# Altium schematic symbol library Sang_library.SchLib: 1607 symbols (part 15 of 15)
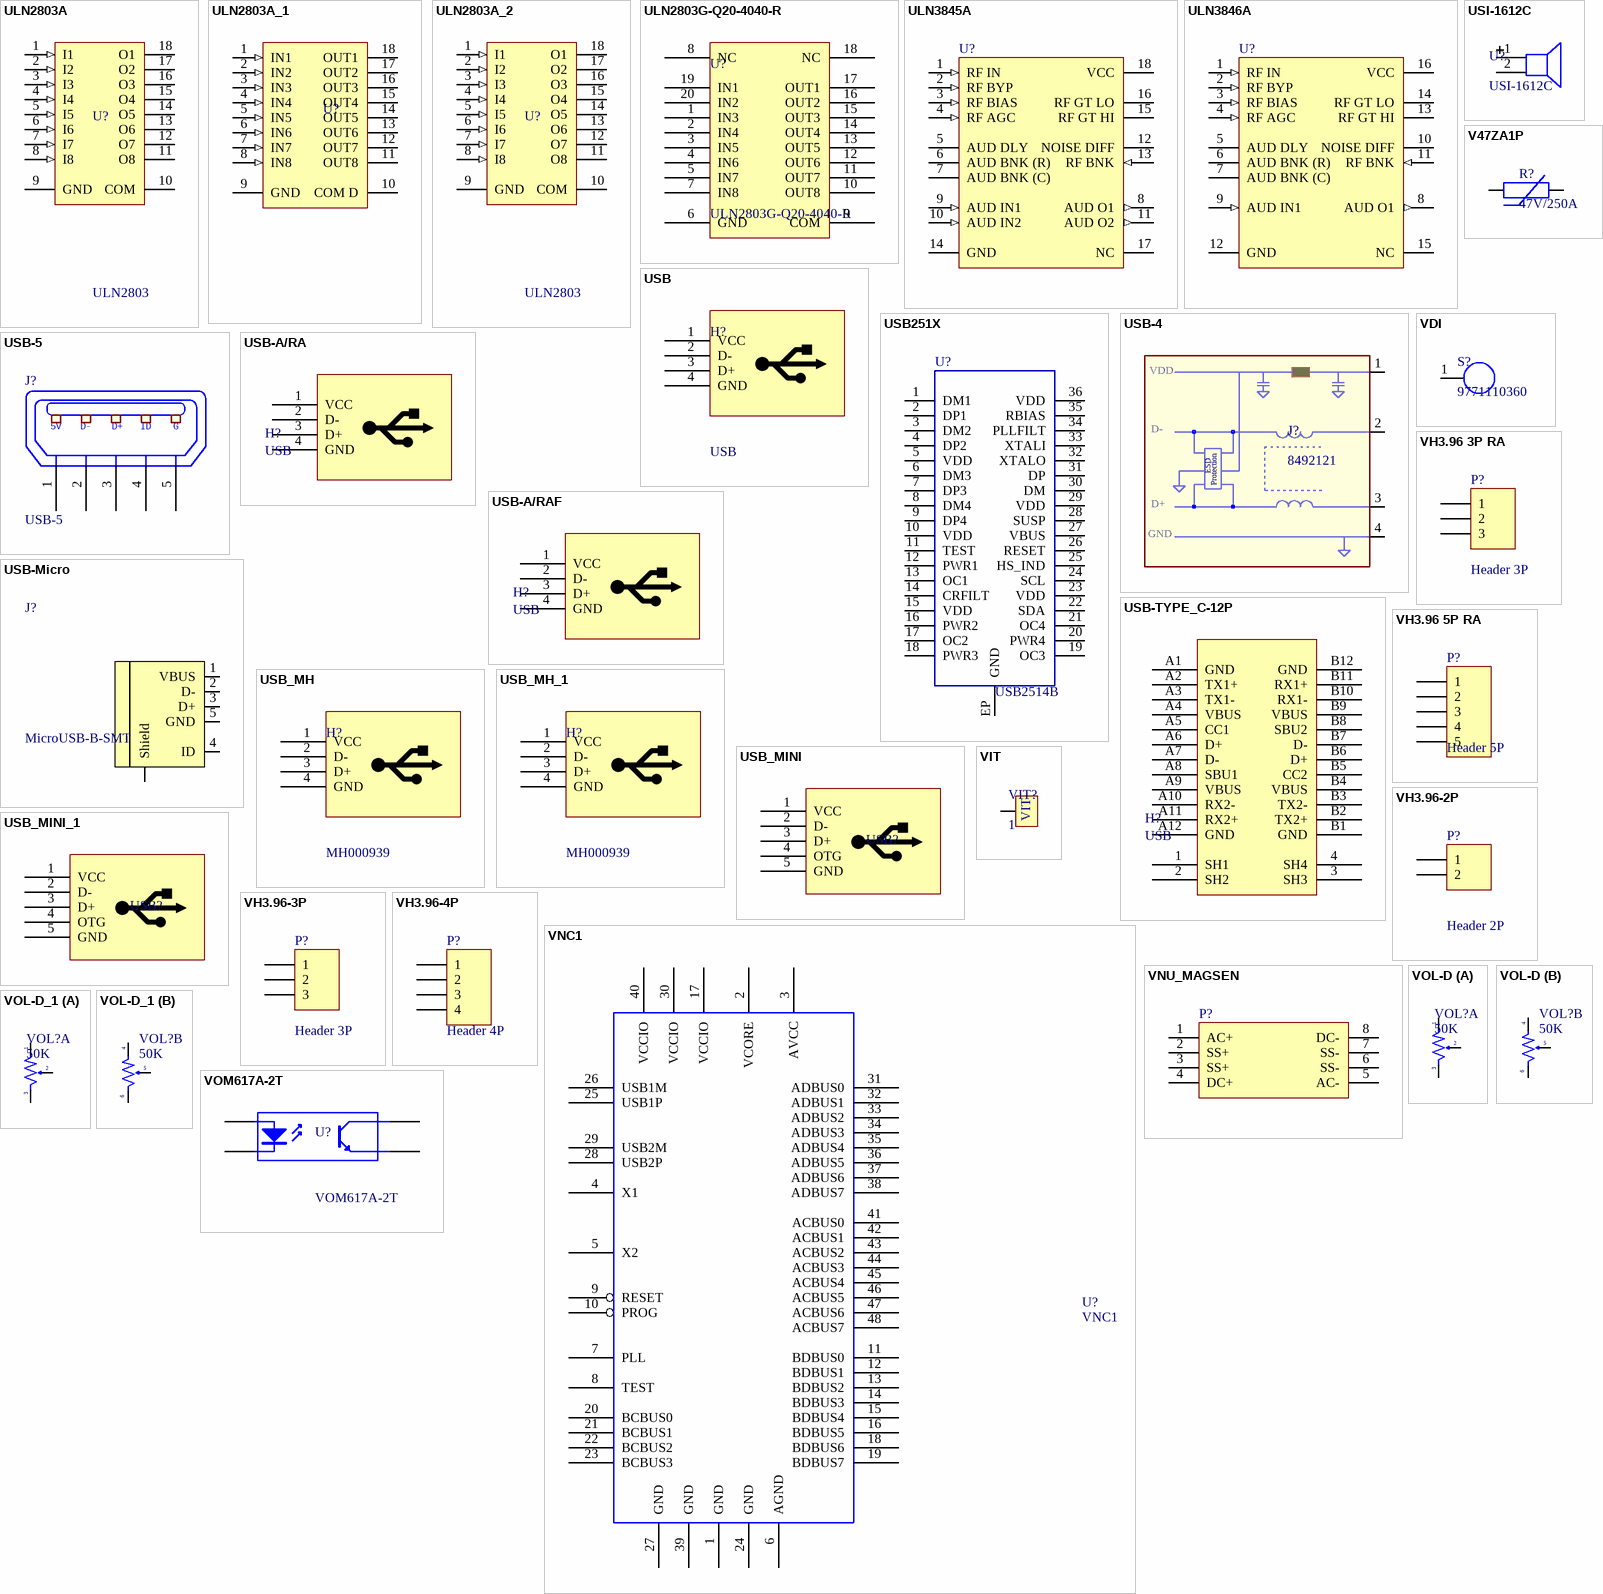
[diagram p111: symbols ULN2803A to VOM617A-2T]

## USB251X
designator U?, comment USB2514B
IC HUB CTLR 4PORT USB 2.0 HS 36S; MPN: USB2514B/M2; Solder: SMT; Value: USB2514B; Category: IC
footprint QFN36(USB251x)
pins: 1 DM1, 2 DP1, 3 DM2, 4 DP2, 5 VDD, 6 DM3, 7 DP3, 8 DM4, 9 DP4, 10 VDD, 11 TEST, 12 PWR1, 13 OC1, 14 CRFILT, 15 VDD, 16 PWR2, 17 OC2, 18 PWR3, 19 OC3, 20 PWR4, 21 OC4, 22 SDA, 23 VDD, 24 SCL, 25 HS_IND, 26 RESET, 27 VBUS, 28 SUSP, 29 VDD, 30 DM, 31 DP, 32 XTALO, 33 XTALI, 34 PLLFILT, 35 RBIAS, 36 VDD, EP GND

## USB-4
designator J?, comment 8492121
THT USB 2.0 A Connector WE-EPLE; Manufacturer: Würth Elektronik eiSos GmbH; PartNo: 8492121; ComponentLink1Description: Manufacturer; ComponentLink1URL: http://www.we-online.de; Created by: Christin Otto; Created Date: OCT-2014; ComponentLink2Description: Datasheet; ComponentLink2URL: http://www.we-online.de/katalog/media/pdf/8492121.pdf
footprint USB-C1 (THT, USB 2.0 A Connector, 4Pin, Body 15.8 x14.5mm)
footprint USB-D1
footprint USB-C2
footprint USB-C3
footprint USB-D2 (For USB SMD)
pins: 1 VBUS, 2 D-, 3 D+, 4 GND
text: VDD; ESD; Protection

## USB-5
designator J?
Manufacturer: FCI; Manufacturer Part Number: 10118193-0001LF; Connector Type: USB - micro B; Number of Contacts: 5; Gender: Receptacle; Specifications: USB 2.0; .Creator: MM; .Checked PCB: RF; Supplier 1: Digi-Key; RoHS: RoHS Compliant; Category: Connectors, Interconnects; Stock 1: 28642; Pricing 1: 1=0.46, 10=0.433, 25=0.3712, 50=0.3156, 100=0.3032, 250=0.27224, 500=0.25988 (USD); Packaging: Cut Tape (CT); Mounting Type: Surface Mount, Right Angle, Horizontal; Features: Shielded, Solder Retention; Ingress Protection: -; ComponentLink1URL: http://portal.fciconnect.com/Comergent//fci/drawing/10118193.pdf; ComponentLink1Description: http://portal.fciconnect.com/Comergent//fci/drawing/10118193.pdf; Supplier Part Number 1: 609-4616-1-ND; .Checked SCH: MM
footprint USB-M1
footprint USB-M2
footprint USB-M3
footprint USB-M4
footprint USB-M5
footprint USB-M6 (MOLEX 51387-0571)
footprint USB-M7
pins: 1 P1, 2 P2, 3 P3, 4 P4, 5 P5
text: 5V; D-; D+; ID; G

## USB-A/RA
designator H?, comment USB
USB A/RA Type
footprint USB-A-DEVICE-RA (USB Type A)
pins: 1 VCC, 2 D-, 3 D+, 4 GND

## USB-A/RAF
designator H?, comment USB
USB A/RA Type
footprint USB-A-HOST-RA
footprint USB-A-HOST-ST
pins: 1 VCC, 2 D-, 3 D+, 4 GND

## USB-Micro
designator J?, comment MicroUSB-B-SMT
MPN: FCI 10118193-0001LF; MFR: Amphenol FCI
footprint USB - MicroUSB MK5P DIP
pins: 1 VBUS (power), 2 D-, 3 D+, 4 ID, 5 GND (power), 6 Shield (power)

## USB-TYPE_C-12P
designator H?, comment USB
USB-TYPE_C-12P
footprint USB-TYPE-C-12P (Footprint not found)
pins: 1 SH1, 2 SH2, 3 SH3, 4 SH4, A1 GND, A2 TX1+, A3 TX1-, A4 VBUS, A5 CC1, A6 D+, A7 D-, A8 SBU1, A9 VBUS, A10 RX2-, A11 RX2+, A12 GND, B1 GND, B2 TX2+, B3 TX2-, B4 VBUS, B5 CC2, B6 D+, B7 D-, B8 SBU2, B9 VBUS, B10 RX1-, B11 RX1+, B12 GND

## USB_MH
designator H?, comment MH000939
Cắm; Value: USB B Cắm
footprint USB-B-STRANGE (USB Type B - STRANGE - Slave Device)
footprint USB-A-RA (USB Type A)
footprint USBHOSTB
footprint USB_B_MINI_SMD
footprint USB_B_MINI
footprint USB-S1 (USB A connector, 4pin, For USB sing)
footprint USB-S2 (USB B connector, 4pin, For Print)
footprint USB_B (USB A connector, 4pin, For USB sing)
pins: 1 VCC, 2 D-, 3 D+, 4 GND, 5 hidden, 6 hidden

## USB_MH_1
designator H?, comment MH000939
Cắm; Value: USB B Cắm
footprint USB-B-STRANGE (USB Type B - STRANGE - Slave Device)
footprint USB-A-RA (USB Type A)
footprint USBHOSTB
footprint USB_B_MINI_SMD
footprint USB_B_MINI
footprint USB-S1 (USB A connector, 4pin, For USB sing)
footprint USB-S2 (USB B connector, 4pin, For Print)
footprint USB_B (USB A connector, 4pin, For USB sing)
pins: 1 VCC, 2 D-, 3 D+, 4 GND, 5 hidden, 6 hidden

## USB_MINI
designator USB?, comment MiniUSB 5P SMD  (value not drawn)
Dán; Ma_Hang: MH001022; Don_Vi: Con; Ten_Linh_Kien: MiniUSB 5P SMD; Kieu_Chan: *; Chung_Loai: Dán; Ghi_Chu: *
footprint USB-B-Mini
pins: 1 VCC, 2 D-, 3 D+, 4 OTG, 5 GND

## USB_MINI_1
designator USB?, comment MiniUSB 5P SMD  (value not drawn)
Dán; Ma_Hang: MH001022; Don_Vi: Con; Ten_Linh_Kien: MiniUSB 5P SMD; Kieu_Chan: *; Chung_Loai: Dán; Ghi_Chu: *
footprint USB-B-Mini
pins: 1 VCC, 2 D-, 3 D+, 4 OTG, 5 GND

## USI-1612C
designator U?
footprint USI-1612C
pins: 1, 2

## V47ZA1P
designator R?, comment 47V/250A
VARISTOR 47V 250A DISC 7MM; MPN: V47ZA1P; Solder: WAVE; CompanyID: VT-00888; Value: 47V/250A; Category: VARISTOR
footprint VARISTOR-V47ZA1P
pins: 1, 2

## VDI
designator S?, comment 9771110360
WA-SMSE SMD Steel Spacer with external Thread; Manufacturer: Wurth Elektronik; partNo: 9771110360; ComponentLink1Description: Manufacturer; ComponentLink1URL: http://www.we-online.de; Created by: Baojun Chen; Created Date: 19.Oct.2015; ComponentLink2Description: Datasheet; ComponentLink2URL: http://katalog.we-online.de/em/datasheet/9771110360.pdf
footprint VDI (SMD Steel Spacer with internal Thread)
footprint VDI1 (SMD Steel Spacer with internal Thread)
pins: 1

## VH3.96 3P RA
designator P?, comment Header 3P
CONN HEADER R/A 3POS 3.96MM; MPN: B3PS-VH(LF)(SN); MFR: JST Sales America Inc.; Solder: WAVE; Value: Header 3P
footprint VH3.96 3P RA (Connector; Header; 5 Position)
pins: 1, 2, 3

## VH3.96 5P RA
designator P?, comment Header 5P
CONN HEADER R/A 5POS 3.96MM; MPN: B5PS-VH(LF)(SN); MFR: JST Sales America Inc.; CompanyID: VT-00125; Solder: WAVE; Value: Header 5P
footprint VH3.96 5P RA (Connector; Header; 5 Position)
pins: 1, 2, 3, 4, 5

## VH3.96-2P
designator P?, comment Header 2P
Header, 2 Pin Pitch 3.96mm; MPN: VH3.96-2P; Solder: WAVE; Value: Header 2P
footprint VH3.96-2P (Footprint not found)
pins: 1, 2

## VH3.96-3P
designator P?, comment Header 3P
Header, 3 Pin Pitch 3.96mm; MPN: VH3.96-3P; Solder: WAVE; Value: Header 3P
footprint VH3.96-3P (Footprint not found)
pins: 1, 2, 3

## VH3.96-4P
designator P?, comment Header 4P
Header, 4 Pin Pitch 3.96mm; MPN: VH3.96-4P; Solder: WAVE; Value: Header 4P
footprint VH3.96-4P (Footprint not found)
pins: 1, 2, 3, 4

## VIT
designator VIT?, comment 1
Oc Vit
footprint VIT
pins: VIT1 1

## VNC1
designator U?
VINCULUM USB HOST CONTROLLER; Manufacturer Part Number: VNC1L-1A-REEL; Manufacturer: FTDI, Future Technology Devices International Ltd; Current - Supply: 25mA; Interface: SPI; Voltage - Supply: 3 V ~ 3.6 V; Controller Type: USB 2.0 Controller; Supplier 1: Digi-Key; Supplier Part Number 1: 768-1000-2-ND; Supplier Part Number: 768-1000-2-ND; RoHS: RoHS Compliant; Supplier: Digi-Key; Category: Integrated Circuits (ICs); Operating Temperature: 0°C ~ 70°C; Packaging: Tape & Reel (TR); Package / Case: 48-LQFP
footprint TQFP48
pins: 1 GND, 2 VCORE, 3 AVCC, 4 X1, 5 X2, 6 AGND, 7 PLL, 8 TEST, 9 RESET, 10 PROG, 11 BDBUS0, 12 BDBUS1, 13 BDBUS2, 14 BDBUS3, 15 BDBUS4, 16 BDBUS5, 17 VCCIO, 18 BDBUS6, 19 BDBUS7, 20 BCBUS0, 21 BCBUS1, 22 BCBUS2, 23 BCBUS3, 24 GND, 25 USB1P, 26 USB1M, 27 GND, 28 USB2P, 29 USB2M, 30 VCCIO, 31 ADBUS0, 32 ADBUS1, 33 ADBUS2, 34 ADBUS3, 35 ADBUS4, 36 ADBUS5, 37 ADBUS6, 38 ADBUS7, 39 GND, 40 VCCIO, 41 ACBUS0, 42 ACBUS1, 43 ACBUS2, 44 ACBUS3, 45 ACBUS4, 46 ACBUS5, 47 ACBUS6, 48 ACBUS7

## VNU_MAGSEN
designator P?
VNU Magnetic Sensor 2020; Solder: WAVE
footprint VNU_MAG_SEN_V1.0_DIP
footprint VNU_MAG_SEN_V1.0_SMD
pins: 1 AC+, 2 SS+, 3 SS+, 4 DC+, 5 AC-, 6 SS-, 7 SS-, 8 DC-

## VOL-D
designator VOL?, comment 50K
Volume control Dual; Value: Volume Dual 50K
footprint VOL-D (Volume control Dual)
part A pins: 1, 2, 3
part B pins: 4, 5, 6

## VOL-D_1
designator VOL?, comment 50K
Volume control Dual; Value: Volume Dual 50K
footprint VOL-D (Volume control Dual)
part A pins: 1, 2, 3
part B pins: 4, 5, 6

## VOM617A-2T
designator U?
OPTOISOLATOR 3.75KV TRANS 4-SOP; Solder: SMT; CompanyID: VT-xxxx; MPN: VOM617A-2T; Value: VOM617A-2T
footprint OPTO TRANSISTOR_SOP-4
pins: 1, 2, 3, 4

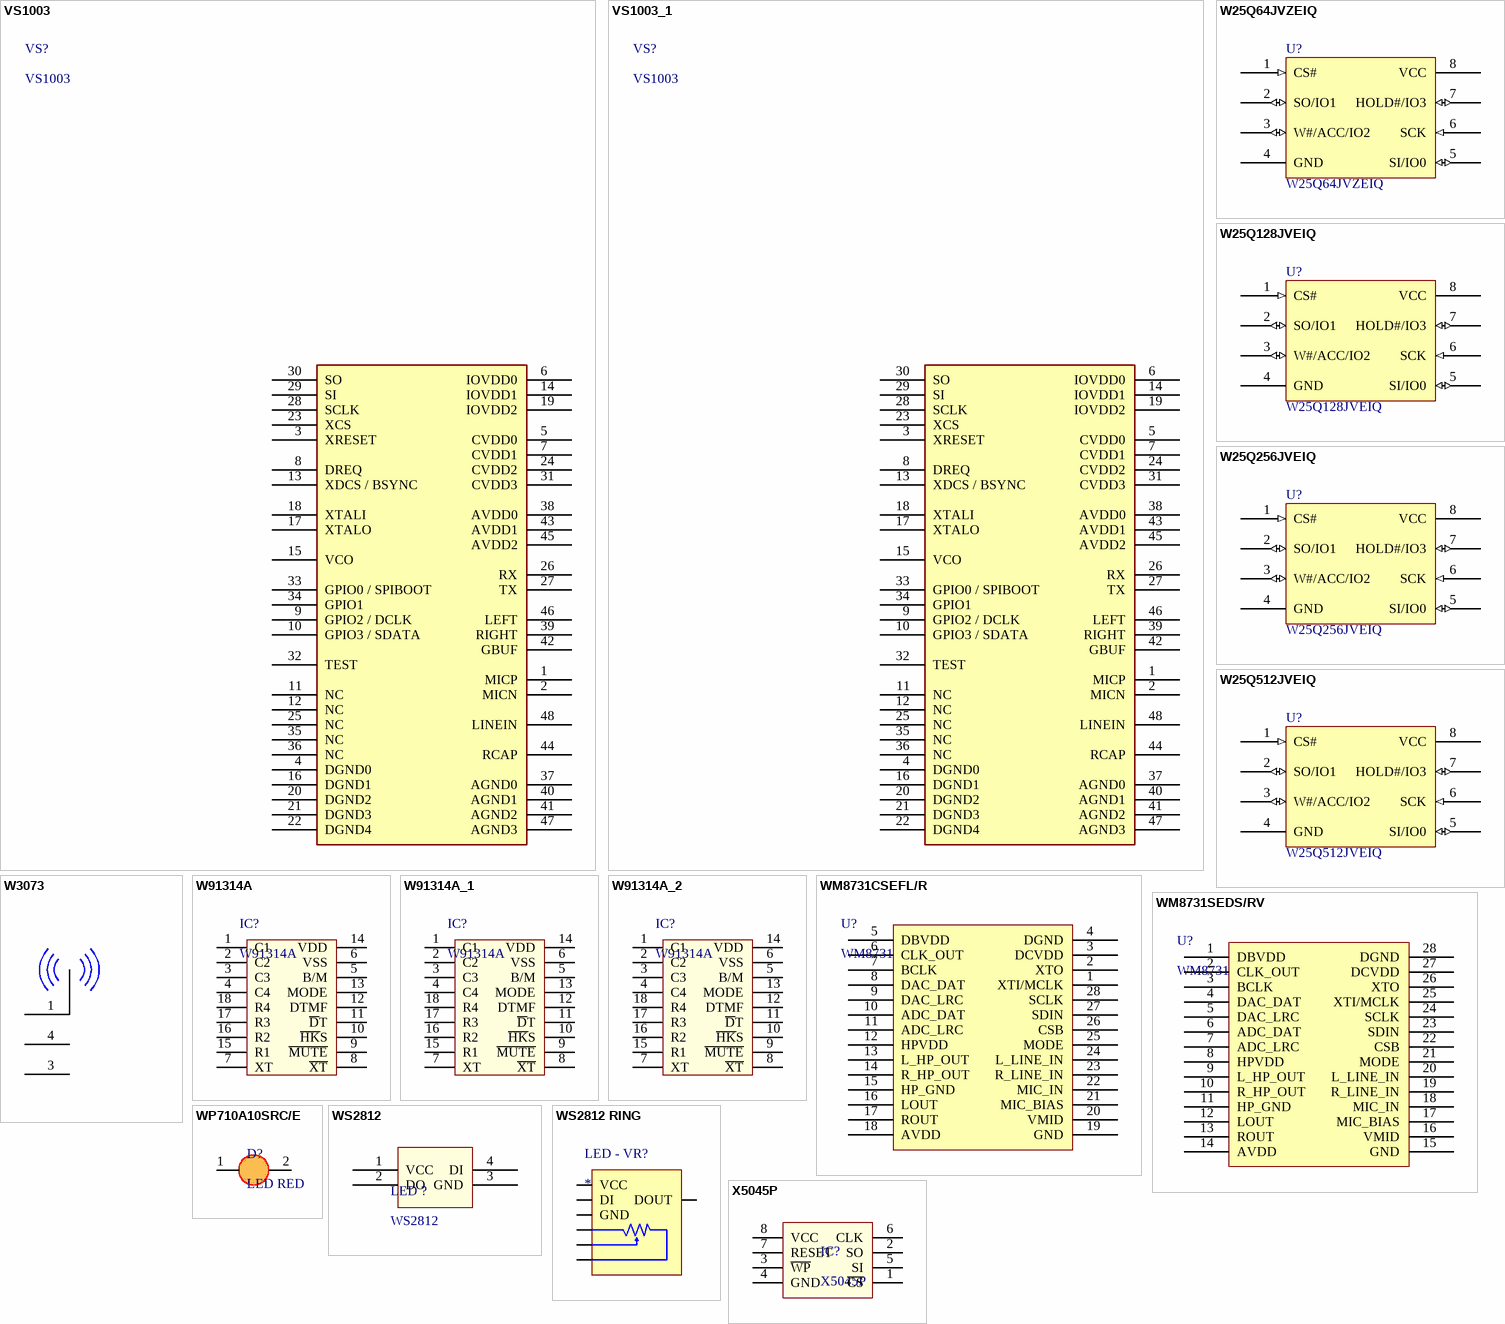
[diagram p96: symbols VS1003 to X5045P]

## VS1003
designator VS?
footprint LQFP 48
pins: 1 MICP, 2 MICN, 3 XRESET, 4 DGND0, 5 CVDD0, 6 IOVDD0, 7 CVDD1, 8 DREQ, 9 GPIO2 / DCLK, 10 GPIO3 / SDATA, 11 NC, 12 NC, 13 XDCS / BSYNC, 14 IOVDD1, 15 VCO, 16 DGND1, 17 XTALO, 18 XTALI, 19 IOVDD2, 20 DGND2, 21 DGND3, 22 DGND4, 23 XCS, 24 CVDD2, 25 NC, 26 RX, 27 TX, 28 SCLK, 29 SI, 30 SO, 31 CVDD3, 32 TEST, 33 GPIO0 / SPIBOOT, 34 GPIO1, 35 NC, 36 NC, 37 AGND0, 38 AVDD0, 39 RIGHT, 40 AGND1, 41 AGND2, 42 GBUF, 43 AVDD1, 44 RCAP, 45 AVDD2, 46 LEFT, 47 AGND3, 48 LINEIN

## VS1003_1
designator VS?, comment VS1003
footprint LQFP 48
pins: 1 MICP, 2 MICN, 3 XRESET, 4 DGND0, 5 CVDD0, 6 IOVDD0, 7 CVDD1, 8 DREQ, 9 GPIO2 / DCLK, 10 GPIO3 / SDATA, 11 NC, 12 NC, 13 XDCS / BSYNC, 14 IOVDD1, 15 VCO, 16 DGND1, 17 XTALO, 18 XTALI, 19 IOVDD2, 20 DGND2, 21 DGND3, 22 DGND4, 23 XCS, 24 CVDD2, 25 NC, 26 RX, 27 TX, 28 SCLK, 29 SI, 30 SO, 31 CVDD3, 32 TEST, 33 GPIO0 / SPIBOOT, 34 GPIO1, 35 NC, 36 NC, 37 AGND0, 38 AVDD0, 39 RIGHT, 40 AGND1, 41 AGND2, 42 GBUF, 43 AVDD1, 44 RCAP, 45 AVDD2, 46 LEFT, 47 AGND3, 48 LINEIN

## W25Q64JVZEIQ
designator U?
IC FLASH 64M SPI 133MHZ 8WSON; MFR: Winbond Electronics; Solder: SMT; MPN: W25Q64JVZEIQ; Value: W25Q64JVZEIQ; Category: IC; PinCount: 9
footprint WSON-8 (6x8mm)
pins: 1 CS# (in), 2 SO/IO1 (io), 3 W#/ACC/IO2 (io), 4 GND (power), 5 SI/IO0 (io), 6 SCK (in), 7 HOLD#/IO3 (io), 8 VCC (power)

## W25Q128JVEIQ
designator U?
IC FLASH 128M SPI 133MHZ 8WSON; MFR: Winbond Electronics; Solder: SMT; MPN: W25Q128JVEIQ; Value: W25Q128JVEIQ; Category: IC; PinCount: 9
footprint WSON-8 (6x8mm)
pins: 1 CS# (in), 2 SO/IO1 (io), 3 W#/ACC/IO2 (io), 4 GND (power), 5 SI/IO0 (io), 6 SCK (in), 7 HOLD#/IO3 (io), 8 VCC (power)

## W25Q256JVEIQ
designator U?
IC FLASH 256M SPI 133MHZ 8WSON; MFR: Winbond Electronics; Solder: SMT; MPN: W25Q256JVEIQ; Value: W25Q256JVEIQ; Category: IC; PinCount: 9
footprint WSON-8 (6x8mm)
pins: 1 CS# (in), 2 SO/IO1 (io), 3 W#/ACC/IO2 (io), 4 GND (power), 5 SI/IO0 (io), 6 SCK (in), 7 HOLD#/IO3 (io), 8 VCC (power)

## W25Q512JVEIQ
designator U?
IC FLASH 512M-BIT 4KB UNIFORM; MFR: Winbond Electronics; Solder: SMT; MPN: W25Q512JVEIQ; Value: W25Q512JVEIQ; Category: IC; PinCount: 9
footprint WSON-8 (6x8mm)
pins: 1 CS# (in), 2 SO/IO1 (io), 3 W#/ACC/IO2 (io), 4 GND (power), 5 SI/IO0 (io), 6 SCK (in), 7 HOLD#/IO3 (io), 8 VCC (power)

## W3073
designator AT?  (value not drawn)
Ceramic Quad Band Monopole Antenna; MFR: PulseLarsen Antennas; Solder: SMT; MPN: W3073; Value: W3073
footprint W3073_VER1
footprint W3073_VER2 (Footprint not found)
footprint W3073_VER3 (Footprint not found)
pins: 1, 3 1, 4 AT

## W91314A
designator IC?
TONE/PULSE DIALER WITH  REDIAL FUNCTION; Creat by: VanDungEvn@Gmail.com
footprint DIP18/W0.3 (18 PIN, W 300mil, Pin to pin 100mil)
pins: 1 C1, 2 C2, 3 C3, 4 C4, 5 B/M, 6 VSS, 7 XT, 8 ~{XT}, 9 ~{MUTE}, 10 ~{HK}S, 11 ~{D}T, 12 DTMF, 13 MODE, 14 VDD, 15 R1, 16 R2, 17 R3, 18 R4

## W91314A_1
designator IC?, comment W91314A
TONE/PULSE DIALER WITH  REDIAL FUNCTION; Creat by: VanDungEvn@Gmail.com
footprint DIP18 (DIP; 18 Leads; Row Spacing 7.62 mm; Pitch 2.54 mm)
pins: 1 C1, 2 C2, 3 C3, 4 C4, 5 B/M, 6 VSS, 7 XT, 8 ~{XT}, 9 ~{MUTE}, 10 ~{HK}S, 11 ~{D}T, 12 DTMF, 13 MODE, 14 VDD, 15 R1, 16 R2, 17 R3, 18 R4

## W91314A_2
designator IC?, comment W91314A
TONE/PULSE DIALER WITH  REDIAL FUNCTION; Creat by: VanDungEvn@Gmail.com
footprint DIP18/W0.3 (18 PIN, W 300mil, Pin to pin 100mil)
pins: 1 C1, 2 C2, 3 C3, 4 C4, 5 B/M, 6 VSS, 7 XT, 8 ~{XT}, 9 ~{MUTE}, 10 ~{HK}S, 11 ~{D}T, 12 DTMF, 13 MODE, 14 VDD, 15 R1, 16 R2, 17 R3, 18 R4

## WM8731CSEFL/R
designator U?, comment WM8731
IC CODEC PORT INTERNET 28QFN; MPN: WM8731CSEFL/R; Solder: SMT; Value: WM8731; Category: IC
footprint QFN50P500X500X85_HS-29N (QFN, 28-Leads, Body 5.00x5.00mm, Pitch 0.50mm, Thermal Pad 3.10x3.10mm, IPC Medium Density)
pins: 1 XTI/MCLK, 2 XTO, 3 DCVDD, 4 DGND, 5 DBVDD, 6 CLK_OUT, 7 BCLK, 8 DAC_DAT, 9 DAC_LRC, 10 ADC_DAT, 11 ADC_LRC, 12 HPVDD, 13 L_HP_OUT, 14 R_HP_OUT, 15 HP_GND, 16 LOUT, 17 ROUT, 18 AVDD, 19 GND, 20 VMID, 21 MIC_BIAS, 22 MIC_IN, 23 R_LINE_IN, 24 L_LINE_IN, 25 MODE, 26 CSB, 27 SDIN, 28 SCLK

## WM8731SEDS/RV
designator U?, comment WM8731
IC CODEC PORT INTERNET 28SSOP; MPN: WM8731SEDS/RV; Solder: SMT; Value: WM8731; Category: IC
footprint SSOP28 (Footprint not found)
pins: 1 DBVDD, 2 CLK_OUT, 3 BCLK, 4 DAC_DAT, 5 DAC_LRC, 6 ADC_DAT, 7 ADC_LRC, 8 HPVDD, 9 L_HP_OUT, 10 R_HP_OUT, 11 HP_GND, 12 LOUT, 13 ROUT, 14 AVDD, 15 GND, 16 VMID, 17 MIC_BIAS, 18 MIC_IN, 19 R_LINE_IN, 20 L_LINE_IN, 21 MODE, 22 CSB, 23 SDIN, 24 SCLK, 25 XTI/MCLK, 26 XTO, 27 DCVDD, 28 DGND

## WP710A10SRC/E
designator D?, comment LED RED
LED RED CLEAR 3MM ROUND T/H; MPN: WP710A10SRC/E; CompanyID: VT-00176; Solder: WAVE; Value: LED RED
footprint LED_3MM-RED
pins: 1 A, 2 K

## WS2812
designator LED ?
footprint LED WS2812 (LED WS2812 RGB 5050)
footprint LED WS2813 2020 (2020 Size)
pins: 1 VCC, 2 DO, 3 GND, 4 DI

## WS2812 RING
designator LED - VR?
footprint WS2812b RING
pins: 1, 2, 3, 4 DI, 5 GND, 6 VCC, 7 DOUT

## X5045P
designator IC?
4K SPI EEPROM
footprint DIP8
footprint SO8 (SOIC, 8-Leads, Body 4.9x3.9mm, Pitch 1.27mm, IPC High Density)
footprint MSOP8 (MSOP, 8-Leads, Body 3.00x3.00mm, Pitch 0.65mm, IPC High Density)
pins: 1 ~{CS}, 2 SO, 3 ~{WP}, 4 GND, 5 SI, 6 CLK, 7 RESET, 8 VCC

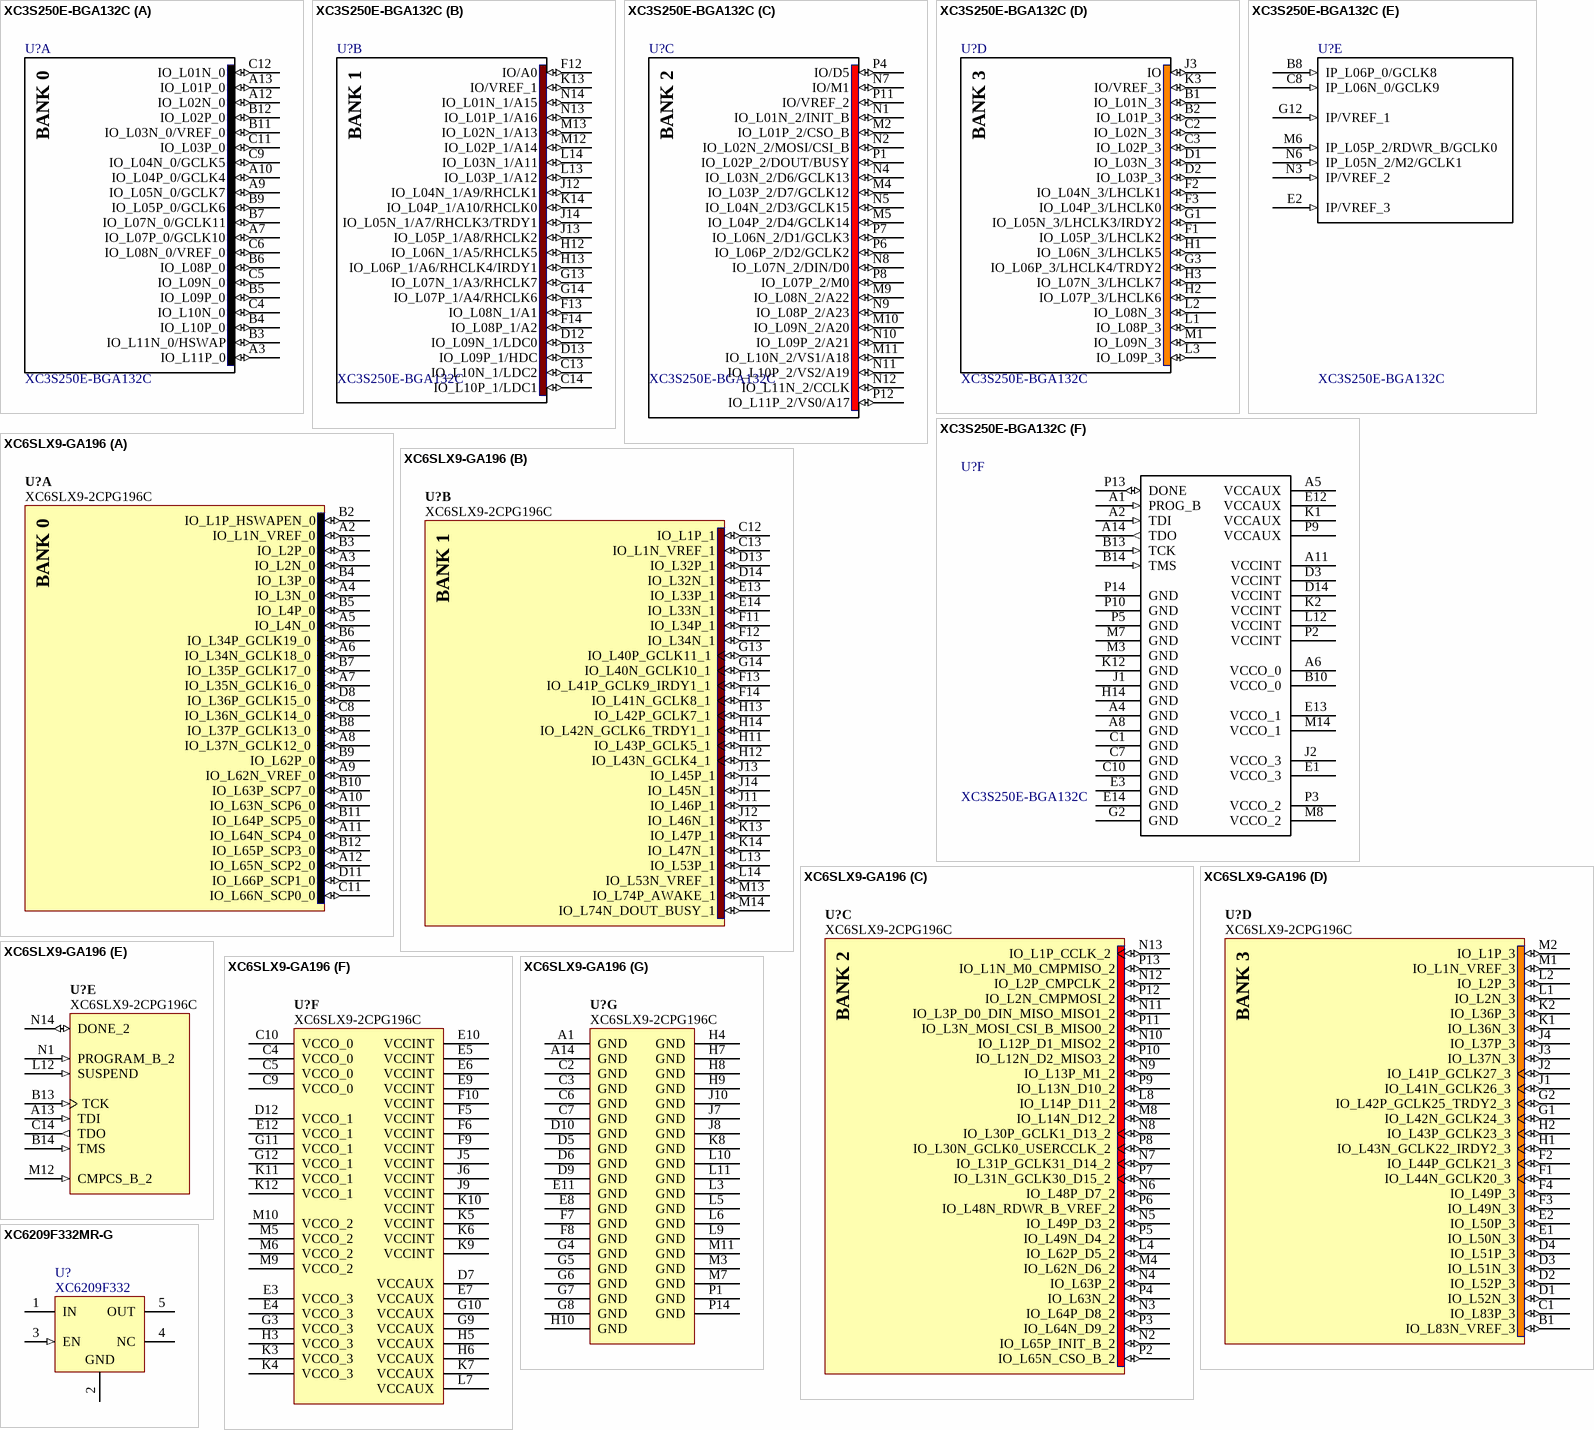
[diagram p97: symbols XC3S250E-BGA132C to XC6209F332MR-G]

## XC3S250E-BGA132C
designator U?
Spartan-3E 1.2V FPGA, 92 User I/Os, 132-Ball Chip-Scale BGA, Standard Performance, Commercial Grade, Pb-Free; FirstPublished: 6-Jun-2005; LatestRevisionDate: 30-Oct-2009; LatestRevisionNote: Updated to datasheet version 3.8 Aug-2009.; DatasheetVersion: ver3.8, Aug-2009; PackageVersion: ver1.3, Jun-2008; PackageReference: CPG132; Publisher: Altium Limited; PackageDescription: 132-Ball Chip Scale Ball Grid Array 0.5 mm Pitch (CPG132) - Pb-Free; Supplier 1: Digi-Key; Supplier Part Number 1: 122-1518-ND; ComponentLink1Description: Spartan-3E Datasheet; ComponentLink1URL: http://www.xilinx.com/support/documentation/data_sheets/ds312.pdf; ComponentLink2Description: CPG132 Package Drawing; ComponentLink2URL: http://www.xilinx.com/support/documentation/package_specs/cp132.pdf; ComponentLink3Description: Spartan-3E Documents; ComponentLink3URL: http://www.xilinx.com/support/documentation/spartan-3e.htm; ComponentLink4Description: Xilinx.com Home; ComponentLink4URL: http://www.xilinx.com
footprint CPG132 (BGA, 132-Leads, Body 8x8mm, Pitch 0.5mm)
part A pins: A3 IO_L11P_0 (io), A7 IO_L07P_0/GCLK10 (io), A9 IO_L05N_0/GCLK7 (io), A10 IO_L04P_0/GCLK4 (io), A12 IO_L02N_0 (io), A13 IO_L01P_0 (io), B3 IO_L11N_0/HSWAP (io), B4 IO_L10P_0 (io), B5 IO_L09P_0 (io), B6 IO_L08P_0 (io), B7 IO_L07N_0/GCLK11 (io), B9 IO_L05P_0/GCLK6 (io), B11 IO_L03N_0/VREF_0 (io), B12 IO_L02P_0 (io), C4 IO_L10N_0 (io), C5 IO_L09N_0 (io), C6 IO_L08N_0/VREF_0 (io), C9 IO_L04N_0/GCLK5 (io), C11 IO_L03P_0 (io), C12 IO_L01N_0 (io)
part B pins: C13 IO_L10N_1/LDC2 (io), C14 IO_L10P_1/LDC1 (io), D12 IO_L09N_1/LDC0 (io), D13 IO_L09P_1/HDC (io), F12 IO/A0 (io), F13 IO_L08N_1/A1 (io), F14 IO_L08P_1/A2 (io), G13 IO_L07N_1/A3/RHCLK7 (io), G14 IO_L07P_1/A4/RHCLK6 (io), H12 IO_L06N_1/A5/RHCLK5 (io), H13 IO_L06P_1/A6/RHCLK4/IRDY1 (io), J12 IO_L04N_1/A9/RHCLK1 (io), J13 IO_L05P_1/A8/RHCLK2 (io), J14 IO_L05N_1/A7/RHCLK3/TRDY1 (io), K13 IO/VREF_1 (io), K14 IO_L04P_1/A10/RHCLK0 (io), L13 IO_L03P_1/A12 (io), L14 IO_L03N_1/A11 (io), M12 IO_L02P_1/A14 (io), M13 IO_L02N_1/A13 (io), N13 IO_L01P_1/A16 (io), N14 IO_L01N_1/A15 (io)
part C pins: M2 IO_L01P_2/CSO_B (io), M4 IO_L03P_2/D7/GCLK12 (io), M5 IO_L04P_2/D4/GCLK14 (io), M9 IO_L08N_2/A22 (io), M10 IO_L09N_2/A20 (io), M11 IO_L10N_2/VS1/A18 (io), N1 IO_L01N_2/INIT_B (io), N2 IO_L02N_2/MOSI/CSI_B (io), N4 IO_L03N_2/D6/GCLK13 (io), N5 IO_L04N_2/D3/GCLK15 (io), N7 IO/M1 (io), N8 IO_L07N_2/DIN/D0 (io), N9 IO_L08P_2/A23 (io), N10 IO_L09P_2/A21 (io), N11 IO_L10P_2/VS2/A19 (io), N12 IO_L11N_2/CCLK (io), P1 IO_L02P_2/DOUT/BUSY (io), P4 IO/D5 (io), P6 IO_L06P_2/D2/GCLK2 (io), P7 IO_L06N_2/D1/GCLK3 (io), P8 IO_L07P_2/M0 (io), P11 IO/VREF_2 (io), P12 IO_L11P_2/VS0/A17 (io)
part D pins: B1 IO_L01N_3 (io), B2 IO_L01P_3 (io), C2 IO_L02N_3 (io), C3 IO_L02P_3 (io), D1 IO_L03N_3 (io), D2 IO_L03P_3 (io), F1 IO_L05P_3/LHCLK2 (io), F2 IO_L04N_3/LHCLK1 (io), F3 IO_L04P_3/LHCLK0 (io), G1 IO_L05N_3/LHCLK3/IRDY2 (io), G3 IO_L06P_3/LHCLK4/TRDY2 (io), H1 IO_L06N_3/LHCLK5 (io), H2 IO_L07P_3/LHCLK6 (io), H3 IO_L07N_3/LHCLK7 (io), J3 IO (io), K3 IO/VREF_3 (io), L1 IO_L08P_3 (io), L2 IO_L08N_3 (io), L3 IO_L09P_3 (io), M1 IO_L09N_3 (io)
part E pins: B8 IP_L06P_0/GCLK8 (in), C8 IP_L06N_0/GCLK9 (in), E2 IP/VREF_3 (in), G12 IP/VREF_1 (in), M6 IP_L05P_2/RDWR_B/GCLK0 (in), N3 IP/VREF_2 (in), N6 IP_L05N_2/M2/GCLK1 (in)
part F pins: A1 PROG_B (in), A2 TDI (in), A4 GND (power), A5 VCCAUX (power), A6 VCCO_0 (power), A8 GND (power), A11 VCCINT (power), A14 TDO (out), B10 VCCO_0 (power), B13 TCK (in), B14 TMS (in), C1 GND (power), C7 GND (power), C10 GND (power), D3 VCCINT (power), D14 VCCINT (power), E1 VCCO_3 (power), E3 GND (power), E12 VCCAUX (power), E13 VCCO_1 (power), E14 GND (power), G2 GND (power), H14 GND (power), J1 GND (power), J2 VCCO_3 (power), K1 VCCAUX (power), K2 VCCINT (power), K12 GND (power), L12 VCCINT (power), M3 GND (power), M7 GND (power), M8 VCCO_2 (power), M14 VCCO_1 (power), P2 VCCINT (power), P3 VCCO_2 (power), P5 GND (power), P9 VCCAUX (power), P10 GND (power), P13 DONE (io), P14 GND (power)
part A text: BANK 0
part B text: BANK 1
part C text: BANK 2
part D text: BANK 3

## XC6SLX9-GA196
designator U?, comment XC6SLX9-2CPG196C
Spartan-6 LX 1.2V FPGA, 106 User I/Os, 196-Ball Chip-Scale BGA (0.5mm Pitch), Speed Grade 2, Commercial Grade, Pb-Free; Code_JEDEC: MO-275; PackageReference: CPG196; PackageDescription: 196-Ball Chip Scale Ball Grid Array 0.5 mm Pitch (CPG196) - Pb-Free; DatasheetVersion: ver1.6, Nov-2010; PackageVersion: ver1.0, Dec-2009
footprint BGA196 (BGA, 196-Leads, Body 8x8mm, Pitch 0.5mm)
part A pins: A2 IO_L1N_VREF_0 (io), A3 IO_L2N_0 (io), A4 IO_L3N_0 (io), A5 IO_L4N_0 (io), A6 IO_L34N_GCLK18_0 (io), A7 IO_L35N_GCLK16_0 (io), A8 IO_L37N_GCLK12_0 (io), A9 IO_L62N_VREF_0 (io), A10 IO_L63N_SCP6_0 (io), A11 IO_L64N_SCP4_0 (io), A12 IO_L65N_SCP2_0 (io), B2 IO_L1P_HSWAPEN_0 (io), B3 IO_L2P_0 (io), B4 IO_L3P_0 (io), B5 IO_L4P_0 (io), B6 IO_L34P_GCLK19_0 (io), B7 IO_L35P_GCLK17_0 (io), B8 IO_L37P_GCLK13_0 (io), B9 IO_L62P_0 (io), B10 IO_L63P_SCP7_0 (io), B11 IO_L64P_SCP5_0 (io), B12 IO_L65P_SCP3_0 (io), C8 IO_L36N_GCLK14_0 (io), C11 IO_L66N_SCP0_0 (io), D8 IO_L36P_GCLK15_0 (io), D11 IO_L66P_SCP1_0 (io)
part B pins: C12 IO_L1P_1 (io), C13 IO_L1N_VREF_1 (io), D13 IO_L32P_1 (io), D14 IO_L32N_1 (io), E13 IO_L33P_1 (io), E14 IO_L33N_1 (io), F11 IO_L34P_1 (io), F12 IO_L34N_1 (io), F13 IO_L41P_GCLK9_IRDY1_1 (io), F14 IO_L41N_GCLK8_1 (io), G13 IO_L40P_GCLK11_1 (io), G14 IO_L40N_GCLK10_1 (io), H11 IO_L43P_GCLK5_1 (io), H12 IO_L43N_GCLK4_1 (io), H13 IO_L42P_GCLK7_1 (io), H14 IO_L42N_GCLK6_TRDY1_1 (io), J11 IO_L46P_1 (io), J12 IO_L46N_1 (io), J13 IO_L45P_1 (io), J14 IO_L45N_1 (io), K13 IO_L47P_1 (io), K14 IO_L47N_1 (io), L13 IO_L53P_1 (io), L14 IO_L53N_VREF_1 (io), M13 IO_L74P_AWAKE_1 (io), M14 IO_L74N_DOUT_BUSY_1 (io)
part C pins: L4 IO_L62P_D5_2 (io), L8 IO_L14P_D11_2 (io), M4 IO_L62N_D6_2 (io), M8 IO_L14N_D12_2 (io), N2 IO_L65P_INIT_B_2 (io), N3 IO_L64P_D8_2 (io), N4 IO_L63P_2 (io), N5 IO_L49P_D3_2 (io), N6 IO_L48P_D7_2 (io), N7 IO_L31P_GCLK31_D14_2 (io), N8 IO_L30P_GCLK1_D13_2 (io), N9 IO_L13P_M1_2 (io), N10 IO_L12P_D1_MISO2_2 (io), N11 IO_L3P_D0_DIN_MISO_MISO1_2 (io), N12 IO_L2P_CMPCLK_2 (io), N13 IO_L1P_CCLK_2 (io), P2 IO_L65N_CSO_B_2 (io), P3 IO_L64N_D9_2 (io), P4 IO_L63N_2 (io), P5 IO_L49N_D4_2 (io), P6 IO_L48N_RDWR_B_VREF_2 (io), P7 IO_L31N_GCLK30_D15_2 (io), P8 IO_L30N_GCLK0_USERCCLK_2 (io), P9 IO_L13N_D10_2 (io), P10 IO_L12N_D2_MISO3_2 (io), P11 IO_L3N_MOSI_CSI_B_MISO0_2 (io), P12 IO_L2N_CMPMOSI_2 (io), P13 IO_L1N_M0_CMPMISO_2 (io)
part D pins: B1 IO_L83N_VREF_3 (io), C1 IO_L83P_3 (io), D1 IO_L52N_3 (io), D2 IO_L52P_3 (io), D3 IO_L51N_3 (io), D4 IO_L51P_3 (io), E1 IO_L50N_3 (io), E2 IO_L50P_3 (io), F1 IO_L44N_GCLK20_3 (io), F2 IO_L44P_GCLK21_3 (io), F3 IO_L49N_3 (io), F4 IO_L49P_3 (io), G1 IO_L42N_GCLK24_3 (io), G2 IO_L42P_GCLK25_TRDY2_3 (io), H1 IO_L43N_GCLK22_IRDY2_3 (io), H2 IO_L43P_GCLK23_3 (io), J1 IO_L41N_GCLK26_3 (io), J2 IO_L41P_GCLK27_3 (io), J3 IO_L37N_3 (io), J4 IO_L37P_3 (io), K1 IO_L36N_3 (io), K2 IO_L36P_3 (io), L1 IO_L2N_3 (io), L2 IO_L2P_3 (io), M1 IO_L1N_VREF_3 (io), M2 IO_L1P_3 (io)
part E pins: A13 TDI (in), B13 TCK (in), B14 TMS (in), C14 TDO (out), L12 SUSPEND (in), M12 CMPCS_B_2 (in), N1 PROGRAM_B_2 (in), N14 DONE_2 (io)
part F pins: C4 VCCO_0 (power), C5 VCCO_0 (power), C9 VCCO_0 (power), C10 VCCO_0 (power), D7 VCCAUX (power), D12 VCCO_1 (power), E3 VCCO_3 (power), E4 VCCO_3 (power), E5 VCCINT (power), E6 VCCINT (power), E7 VCCAUX (power), E9 VCCINT (power), E10 VCCINT (power), E12 VCCO_1 (power), F5 VCCINT (power), F6 VCCINT (power), F9 VCCINT (power), F10 VCCINT (power), G3 VCCO_3 (power), G9 VCCAUX (power), G10 VCCAUX (power), G11 VCCO_1 (power), G12 VCCO_1 (power), H3 VCCO_3 (power), H5 VCCAUX (power), H6 VCCAUX (power), J5 VCCINT (power), J6 VCCINT (power), J9 VCCINT (power), K3 VCCO_3 (power), K4 VCCO_3 (power), K5 VCCINT (power), K6 VCCINT (power), K7 VCCAUX (power), K9 VCCINT (power), K10 VCCINT (power), K11 VCCO_1 (power), K12 VCCO_1 (power), L7 VCCAUX (power), M5 VCCO_2 (power), M6 VCCO_2 (power), M9 VCCO_2 (power), M10 VCCO_2 (power)
part G pins: A1 GND (power), A14 GND (power), C2 GND (power), C3 GND (power), C6 GND (power), C7 GND (power), D5 GND (power), D6 GND (power), D9 GND (power), D10 GND (power), E8 GND (power), E11 GND (power), F7 GND (power), F8 GND (power), G4 GND (power), G5 GND (power), G6 GND (power), G7 GND (power), G8 GND (power), H4 GND (power), H7 GND (power), H8 GND (power), H9 GND (power), H10 GND (power), J7 GND (power), J8 GND (power), J10 GND (power), K8 GND (power), L3 GND (power), L5 GND (power), L6 GND (power), L9 GND (power), L10 GND (power), L11 GND (power), M3 GND (power), M7 GND (power), M11 GND (power), P1 GND (power), P14 GND (power)
part A text: BANK 0
part B text: BANK 1
part C text: BANK 2
part D text: BANK 3

## XC6209F332MR-G
designator U?, comment XC6209F332
IC REG LINEAR 3.3V 300MA SOT25; MFR: Torex Semiconductor Ltd; MPN: XC6209F332MR-G; Solder: SMT; PinCount: 5; ComponentLink1Description: Manufacturer URL; ComponentLink2URL: http://www.ti.com/general/docs/lit/getliterature.tsp?genericPartNumber=TLV70233&fileType=pdf; ComponentLink3URL: http://www.ti.com/litv/pdf/mpds018i; ComponentLink2Description: Datasheet; Value: XC6209F332; ComponentLink1URL: http://www.ti.com/; ComponentLink3Description: Package Specification; Category: IC
footprint SOT23-5
pins: 1 IN (power) "Input supply voltage", 2 GND (power) "Ground", 3 EN (in) "Enable input", 4 NC "No connected", 5 OUT (power) "Regulated output voltage"

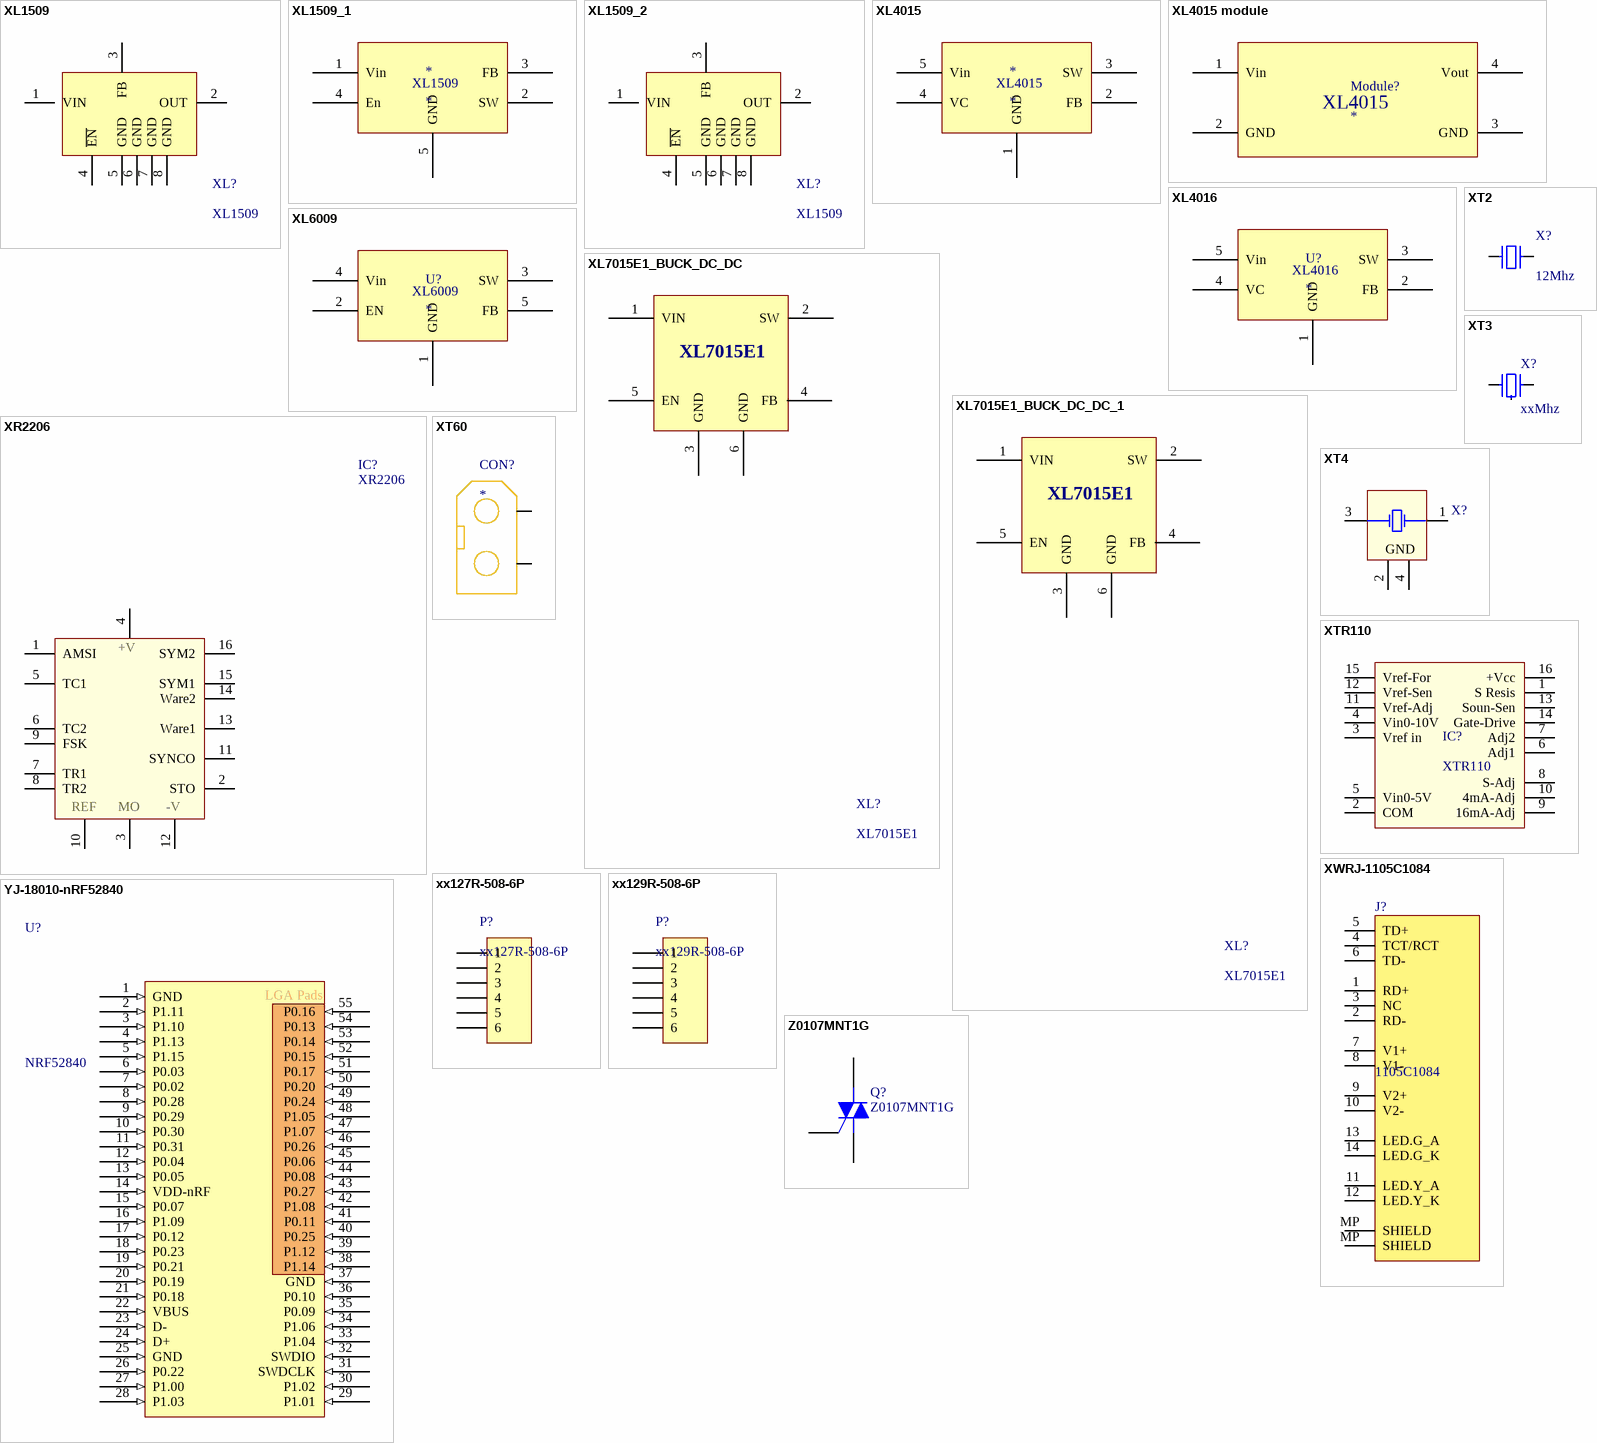
[diagram p98: symbols XL1509 to Z0107MNT1G]

## XL1509
designator XL?
footprint SOP 8
pins: 1 VIN, 2 OUT, 3 FB, 4 ~{EN}, 5 GND, 6 GND, 7 GND, 8 GND

## XL1509_1
designator *
footprint SO8 (SOIC, 8-Leads, Body 4.9x3.9mm, Pitch 1.27mm, IPC High Density); pin to pad 5>5+6+7+8
pins: 1 Vin, 2 SW, 3 FB, 4 En, 5 GND
text: XL1509

## XL1509_2
designator XL?, comment XL1509
footprint SOP 8
pins: 1 VIN, 2 OUT, 3 FB, 4 ~{EN}, 5 GND, 6 GND, 7 GND, 8 GND

## XL4015
designator *
footprint TO263
pins: 1 GND, 2 FB, 3 SW, 4 VC, 5 Vin

## XL4015 module
designator Module?
footprint XL4015 Module Big
pins: 1 Vin, 2 GND, 3 GND, 4 Vout
text: XL4015

## XL4016
designator U?
footprint TO220-5
pins: 1 GND, 2 FB, 3 SW, 4 VC, 5 Vin

## XL6009
designator U?
footprint TO263
pins: 1 GND, 2 EN, 3 SW, 4 Vin, 5 FB

## XL7015E1_BUCK_DC_DC
designator XL?, comment XL7015E1
footprint TO252-5
pins: 1 VIN, 2 SW, 3 GND, 4 FB, 5 EN, 6 GND

## XL7015E1_BUCK_DC_DC_1
designator XL?, comment XL7015E1
footprint TO252-5
pins: 1 VIN, 2 SW, 3 GND, 4 FB, 5 EN, 6 GND

## XR2206
designator IC?
OSC Sine - Square - Triangle; Value: DIP 16; Value: XR2206
footprint DIP16
footprint SO16L (SOIC, 16-Leads, Body 10.30x7.50mm, Pitch 1.27mm, IPC Medium Density)
pins: 1 AMSI, 2 STO, 3 MO, 4 +V, 5 TC1, 6 TC2, 7 TR1, 8 TR2, 9 FSK, 10 REF, 11 SYNCO, 12 -V, 13 Ware1, 14 Ware2, 15 SYM1, 16 SYM2

## XT2
designator X?, comment 12Mhz
Crystal, 32.768 KHz, -40 to 85 degC, 3.2 x 1.5 x 0.9 mm SMD; Value: 4Mhz
footprint XT2 (Footpin for Crystal 2 pin)
footprint XT2N (Crystal 2pin, high 200 mil)
footprint XT2-L (Footpin for Crystal 2 pin)
footprint XT32k
footprint XT2-SMD
footprint XTAL-RU49/4
footprint XT2-32.768KHz-2_V (Hand Drawn, 2-Leads, Body 3.2x1.5mm, Pitch 2.5mm)
pins: 1, 2

## XT3
designator X?, comment xxMhz
Crystal For all Crystal 2pin.; Value: 4Mhz
footprint XT3
footprint BXR315A (Xtal for RF)
pins: 1, 2, 3

## XT4
designator X?
Crystal, 16 MHz, -30 to 85 degC, 3.2 x 2.5 x 0.9 mm SMD; Value: 4Mhz
footprint XT4-SMD
footprint XT4
footprint XT4-16.000MHz-4_V (Hand Drawn, 4-Leads, Body 3.2x2.5 mm)
pins: 1 XTAL, 2 GND (power), 3 XTAL, 4 GND (power)

## XT60
designator CON?
footprint XT60_MALE
footprint XT60_FEMALE
pins: 1, 2

## XTR110
designator IC?
PRECISION VOLTAGE-TO-CURREN  CONVERTER/TRANSMITTER; Designed by: VanDungEvn; Value: XTR110
footprint DIP16
footprint SO16L (SOIC, 16-Leads, Body 10.30x7.50mm, Pitch 1.27mm, IPC Medium Density)
pins: 1 S Resis, 2 COM, 3 Vref in, 4 Vin0-10V, 5 Vin0-5V, 6 Adj1, 7 Adj2, 8 S-Adj, 9 16mA-Adj, 10 4mA-Adj, 11 Vref-Adj, 12 Vref-Sen, 13 Soun-Sen, 14 Gate-Drive, 15 Vref-For, 16 +Vcc

## XWRJ-1105C1084
designator J?, comment 1105C1084
XW-ETLINK 1105C1084 RJ-45 Connector; MPN: XWRJ-1105C1084; Solder: WAVE; MFR: XW-ETLINK; Value: 1105C1084
footprint 1105C1084 (Footprint not found)
pins: 1 RD+, 2 RD-, 3 NC, 4 TCT/RCT, 5 TD+, 6 TD-, 7 V1+, 8 V1-, 9 V2+, 10 V2-, 11 LED.Y_A, 12 LED.Y_K, 13 LED.G_A, 14 LED.G_K, MP SHIELD, MP SHIELD

## xx127R-508-6P
designator P?
footprint xx127R-508-6P
pins: 1, 2, 3, 4, 5, 6

## xx129R-508-6P
designator P?
footprint xx129R-508-6P
pins: 1, 2, 3, 4, 5, 6

## YJ-18010-nRF52840
designator U?, comment NRF52840
MPN: YJ-18010-nRF52840; MFR: HOLYIOT; Solder: SMT; Value: NRF52840; Category: IC; PinCount: 55
footprint YJ-18010-nRF52840 (Footprint not found)
pins: 1 GND (in) "Ground", 2 P1.11 (in) "Digital I/O Trace data", 3 P1.10 (in) "Digital I/O", 4 P1.13 (in) "Digital I/O", 5 P1.15 (in) "Digital I/O", 6 P0.03 (in) "Digital I/O Analog input", 7 P0.02 (in) "Digital I/O Analog input", 8 P0.28 (in) "Digital I/O Analog input", 9 P0.29 (in) "Digital I/O Analog input", 10 P0.30 (in) "Digital I/O Analog input", 11 P0.31 (in) "Digital I/O Analog input", 12 P0.04 (in) "Digital I/O Analog input", 13 P0.05 (in) "Digital I/O Analog input", 14 VDD-nRF (in) "VDD (3.9v max)", 15 P0.07 (in) "Digital I/O Trace clock", 16 P1.09 (in) "Digital I/O Trace data", 17 P0.12 (in) "Digital I/O Trace data", 18 P0.23 (in) "Digital I/O", 19 P0.21 (in) "Digital I/O", 20 P0.19 (in) "Digital I/O", 21 P0.18 (in) "Digital I/O", 22 VBUS (in) "Power (5.8v max)", 23 D- (in) "Digital I/O", 24 D+ (in) "Digital I/O", 25 GND (in) "Ground", 26 P0.22 (in) "Digital I/O", 27 P1.00 (in) "Digital I/O", 28 P1.03 (in) "Digital I/O", 29 P1.01 (in) "Digital I/O", 30 P1.02 (in) "Digital I/O", 31 SWDCLK (in) "SWD for debug and programming", 32 SWDIO (in) "SWD for debug and programming", 33 P1.04 (in) "Digital I/O", 34 P1.06 (in) "Digital I/O", 35 P0.09 (in) "Digital I/O NFC input", 36 P0.10 (in) "Digital I/O NFC input", 37 GND (in) "Ground", 38 P1.14 (in) "Digital I/O", 39 P1.12 (in) "Digital I/O", 40 P0.25 (in) "Digital I/O", 41 P0.11 (in) "Digital I/O", 42 P1.08 (in) "Digital I/O", 43 P0.27 (in) "Digital I/O", 44 P0.08 (in) "Digital I/O", 45 P0.06 (in) "Digital I/O", 46 P0.26 (in) "Digital I/O", 47 P1.07 (in) "Digital I/O", 48 P1.05 (in) "Digital I/O", 49 P0.24 (in) "Digital I/O", 50 P0.20 (in) "Digital I/O", 51 P0.17 (in) "Digital I/O", 52 P0.15 (in) "Digital I/O", 53 P0.14 (in) "Digital I/O", 54 P0.13 (in) "Digital I/O", 55 P0.16 (in) "Digital I/O"
text: LGA Pads

## Z0107MNT1G
designator Q?
TRIAC SENS GATE 600V 1A SOT223; Manufacturer: Littelfuse Inc.; BAPartNumber: VT-xxx; SOLD_BY: SMT; Manufacturer Part Number: Z0107MNT1G; Value: Z0107MNT1G
footprint SOT-223-4
pins: 1 M1, 2 M2, 3 G